# Altium integrated library WE_WR-BHD_Box Header_2.54mm_rev15b.IntLib: 96 symbols (continued)
## WE-2,54mm_Box Header 612050235221 (continued)
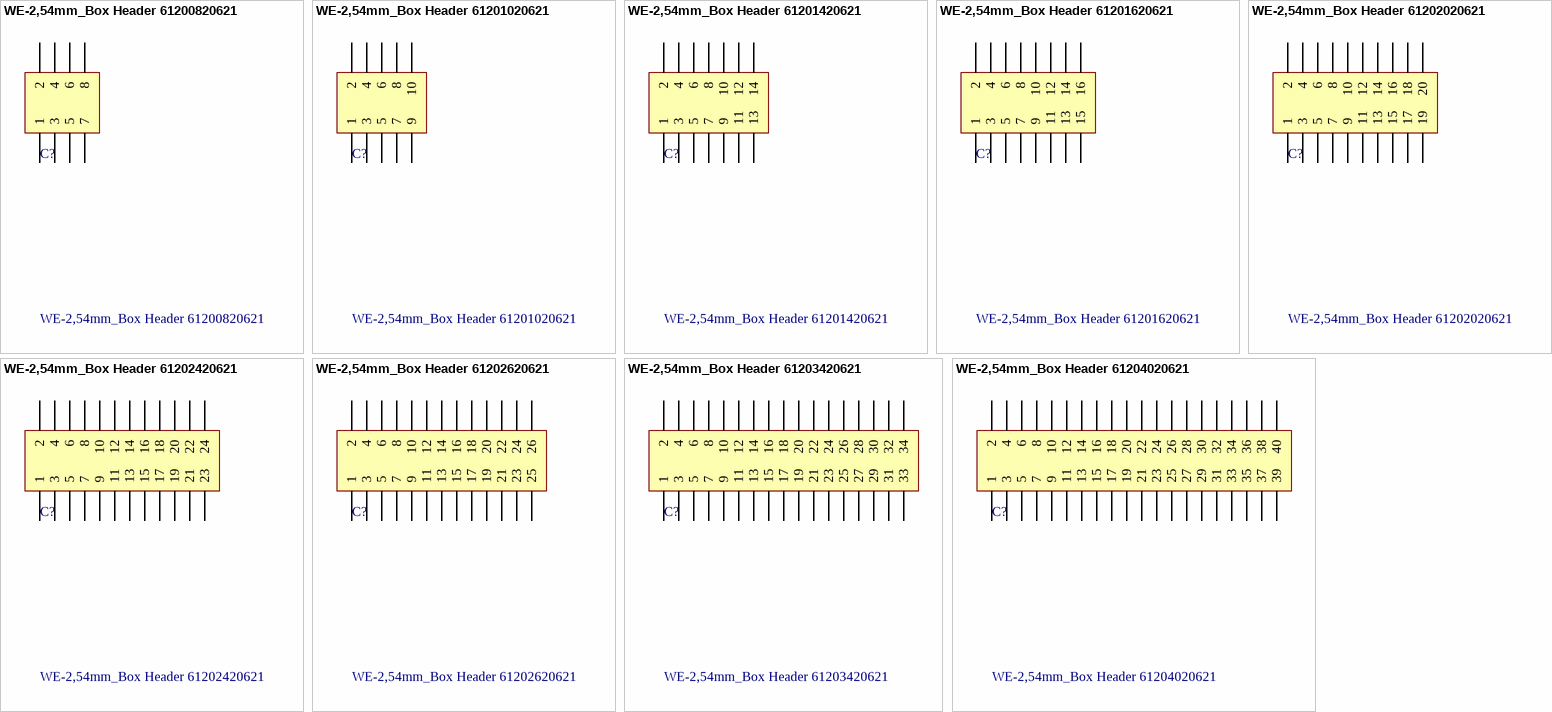
[diagram p4: symbols WE-2,54mm_Box Header 61200820621 to WE-2,54mm_Box Header 61204020621]

## WE-2,54mm_Box Header 61200820621
designator C?
WR-BHD 2.54mm Male SMT Box Header; Manufacturer: Würth Elektronik eiSos GmbH; ComponentLink1 Description: Manufacturer; ComponentLink2 Description: Datasheet; NoPins: 8; Created Date: 8 May 2013; partNo: 61200820621; ComponentLink1URL: http://www.we-online.com; ComponentLink2URL: http://katalog.we-online.de/em/datasheet/6120xx20621.pdf; Created by: Karrer Zheng
footprint 61200820621 (8 pins, SMT, straight, gold plating)
pins: 1, 2, 3, 4, 5, 6, 7, 8

## WE-2,54mm_Box Header 61201020621
designator C?
WR-BHD 2.54mm Male SMT Box Header; Manufacturer: Würth Elektronik eiSos GmbH; ComponentLink1 Description: Manufacturer; ComponentLink2 Description: Datasheet; NoPins: 10; Created Date: 8 May 2013; partNo: 61201020621; ComponentLink1URL: http://www.we-online.com; ComponentLink2URL: http://katalog.we-online.de/em/datasheet/6120xx20621.pdf; Created by: Karrer Zheng
footprint 61201020621 (10 pins, SMT, straight, gold plating)
pins: 1, 2, 3, 4, 5, 6, 7, 8, 9, 10

## WE-2,54mm_Box Header 61201420621
designator C?
WR-BHD 2.54mm Male SMT Box Header; Manufacturer: Würth Elektronik eiSos GmbH; ComponentLink1 Description: Manufacturer; ComponentLink2 Description: Datasheet; NoPins: 14; Created Date: 8 May 2013; partNo: 61201420621; ComponentLink1URL: http://www.we-online.com; ComponentLink2URL: http://katalog.we-online.de/em/datasheet/6120xx20621.pdf; Created by: Karrer Zheng
footprint 61201420621 (14 pins, SMT, straight, gold plating)
pins: 1, 2, 3, 4, 5, 6, 7, 8, 9, 10, 11, 12, 13, 14

## WE-2,54mm_Box Header 61201620621
designator C?
WR-BHD 2.54mm Male SMT Box Header; Manufacturer: Würth Elektronik eiSos GmbH; ComponentLink1 Description: Manufacturer; ComponentLink2 Description: Datasheet; NoPins: 16; Created Date: 8 May 2013; partNo: 61201620621; ComponentLink1URL: http://www.we-online.com; ComponentLink2URL: http://katalog.we-online.de/em/datasheet/6120xx20621.pdf; Created by: Karrer Zheng
footprint 61201620621 (16 pins, SMT, straight, gold plating)
pins: 1, 2, 3, 4, 5, 6, 7, 8, 9, 10, 11, 12, 13, 14, 15, 16

## WE-2,54mm_Box Header 61202020621
designator C?
WR-BHD 2.54mm Male SMT Box Header; Manufacturer: Würth Elektronik eiSos GmbH; ComponentLink1 Description: Manufacturer; ComponentLink2 Description: Datasheet; NoPins: 20; Created Date: 8 May 2013; partNo: 61202020621; ComponentLink1URL: http://www.we-online.com; ComponentLink2URL: http://katalog.we-online.de/em/datasheet/6120xx20621.pdf; Created by: Karrer Zheng
footprint 61202020621 (20 pins, SMT, straight, gold plating)
pins: 1, 2, 3, 4, 5, 6, 7, 8, 9, 10, 11, 12, 13, 14, 15, 16, 17, 18, 19, 20

## WE-2,54mm_Box Header 61202420621
designator C?
WR-BHD 2.54mm Male SMT Box Header; Manufacturer: Würth Elektronik eiSos GmbH; ComponentLink1 Description: Manufacturer; ComponentLink2 Description: Datasheet; NoPins: 24; Created Date: 8 May 2013; partNo: 61202420621; ComponentLink1URL: http://www.we-online.com; ComponentLink2URL: http://katalog.we-online.de/em/datasheet/6120xx20621.pdf; Created by: Karrer Zheng
footprint 61202420621 (24 pins, SMT, straight, gold plating)
pins: 1, 2, 3, 4, 5, 6, 7, 8, 9, 10, 11, 12, 13, 14, 15, 16, 17, 18, 19, 20, 21, 22, 23, 24

## WE-2,54mm_Box Header 61202620621
designator C?
WR-BHD 2.54mm Male SMT Box Header; Manufacturer: Würth Elektronik eiSos GmbH; ComponentLink1 Description: Manufacturer; ComponentLink2 Description: Datasheet; NoPins: 26; Created Date: 8 May 2013; partNo: 61202620621; ComponentLink1URL: http://www.we-online.com; ComponentLink2URL: http://katalog.we-online.de/em/datasheet/6120xx20621.pdf; Created by: Karrer Zheng
footprint 61202620621 (26 pins, SMT, straight, gold plating)
pins: 1, 2, 3, 4, 5, 6, 7, 8, 9, 10, 11, 12, 13, 14, 15, 16, 17, 18, 19, 20, 21, 22, 23, 24, 25, 26

## WE-2,54mm_Box Header 61203420621
designator C?
WR-BHD 2.54mm Male SMT Box Header; Manufacturer: Würth Elektronik eiSos GmbH; ComponentLink1 Description: Manufacturer; ComponentLink2 Description: Datasheet; NoPins: 34; Created Date: 8 May 2013; partNo: 61203420621; ComponentLink1URL: http://www.we-online.com; ComponentLink2URL: http://katalog.we-online.de/em/datasheet/6120xx20621.pdf; Created by: Karrer Zheng
footprint 61203420621 (34 pins, SMT, straight, gold plating)
pins: 1, 2, 3, 4, 5, 6, 7, 8, 9, 10, 11, 12, 13, 14, 15, 16, 17, 18, 19, 20, 21, 22, 23, 24, 25, 26, 27, 28, 29, 30, 31, 32, 33, 34

## WE-2,54mm_Box Header 61204020621
designator C?
WR-BHD 2.54mm Male SMT Box Header; Manufacturer: Würth Elektronik eiSos GmbH; ComponentLink1 Description: Manufacturer; ComponentLink2 Description: Datasheet; NoPins: 40; Created Date: 8 May 2013; partNo: 61204020621; ComponentLink1URL: http://www.we-online.com; ComponentLink2URL: http://katalog.we-online.de/em/datasheet/6120xx20621.pdf; Created by: Karrer Zheng
footprint 61204020621 (40 pins, SMT, straight, gold plating)
pins: 1, 2, 3, 4, 5, 6, 7, 8, 9, 10, 11, 12, 13, 14, 15, 16, 17, 18, 19, 20, 21, 22, 23, 24, 25, 26, 27, 28, 29, 30, 31, 32, 33, 34, 35, 36, 37, 38, 39, 40


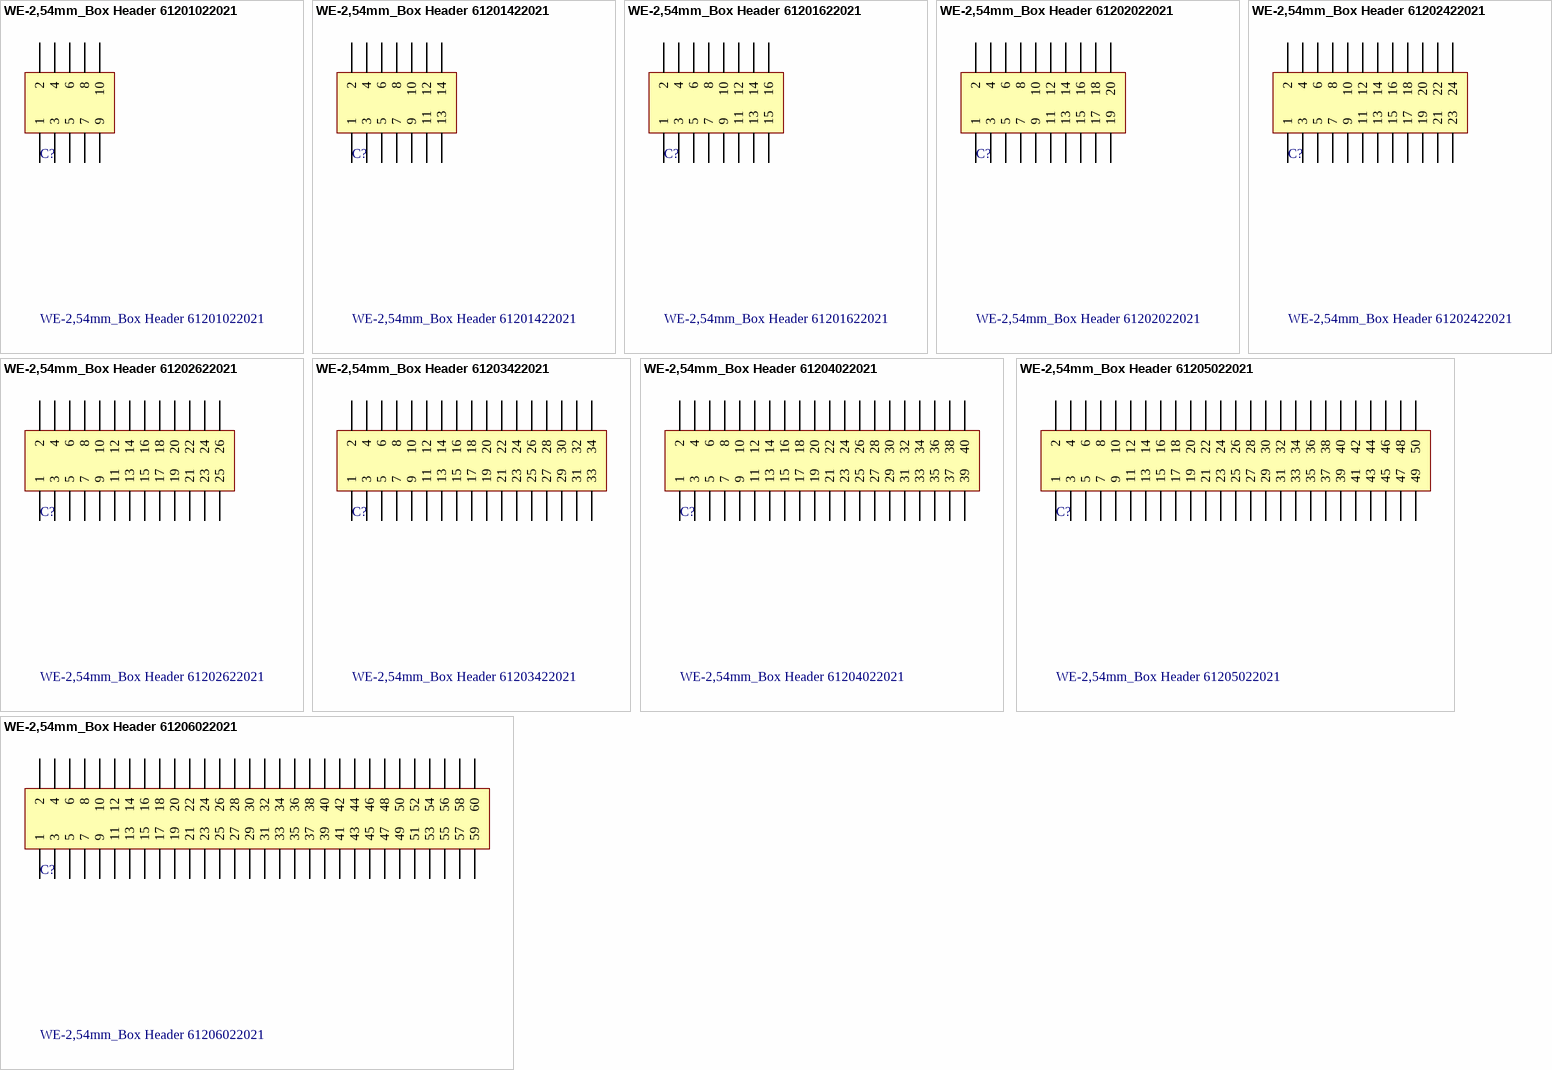
[diagram p5: symbols WE-2,54mm_Box Header 61201022021 to WE-2,54mm_Box Header 61206022021]

## WE-2,54mm_Box Header 61201022021
designator C?
WR-BHD 2.54mm Male Box Header With Lever; Manufacturer: Würth Elektronik eiSos GmbH; ComponentLink1 Description: Manufacturer; ComponentLink2 Description: Datasheet; NoPins: 10; Created Date: 9 May 2013; partNo: 61201022021; ComponentLink1URL: http://www.we-online.com; ComponentLink2URL: http://katalog.we-online.de/em/datasheet/6120xx22021.pdf; Created by: Karrer Zheng
footprint 61201022021 (10 pins, straight, short lever, gold plating)
pins: 1, 2, 3, 4, 5, 6, 7, 8, 9, 10

## WE-2,54mm_Box Header 61201422021
designator C?
WR-BHD 2.54mm Male Box Header With Lever; Manufacturer: Würth Elektronik eiSos GmbH; ComponentLink1 Description: Manufacturer; ComponentLink2 Description: Datasheet; NoPins: 14; Created Date: 9 May 2013; partNo: 61201422021; ComponentLink1URL: http://www.we-online.com; ComponentLink2URL: http://katalog.we-online.de/em/datasheet/6120xx22021.pdf; Created by: Karrer Zheng
footprint 61201422021 (14 pins, straight, short lever, gold plating)
pins: 1, 2, 3, 4, 5, 6, 7, 8, 9, 10, 11, 12, 13, 14

## WE-2,54mm_Box Header 61201622021
designator C?
WR-BHD 2.54mm Male Box Header With Lever; Manufacturer: Würth Elektronik eiSos GmbH; ComponentLink1 Description: Manufacturer; ComponentLink2 Description: Datasheet; NoPins: 16; Created Date: 9 May 2013; partNo: 61201622021; ComponentLink1URL: http://www.we-online.com; ComponentLink2URL: http://katalog.we-online.de/em/datasheet/6120xx22021.pdf; Created by: Karrer Zheng
footprint 61201622021 (16 pins, straight, short lever, gold plating)
pins: 1, 2, 3, 4, 5, 6, 7, 8, 9, 10, 11, 12, 13, 14, 15, 16

## WE-2,54mm_Box Header 61202022021
designator C?
WR-BHD 2.54mm Male Box Header With Lever; Manufacturer: Würth Elektronik eiSos GmbH; ComponentLink1 Description: Manufacturer; ComponentLink2 Description: Datasheet; NoPins: 20; Created Date: 9 May 2013; partNo: 61202022021; ComponentLink1URL: http://www.we-online.com; ComponentLink2URL: http://katalog.we-online.de/em/datasheet/6120xx22021.pdf; Created by: Karrer Zheng
footprint 61202022021 (20 pins, straight, short lever, gold plating)
pins: 1, 2, 3, 4, 5, 6, 7, 8, 9, 10, 11, 12, 13, 14, 15, 16, 17, 18, 19, 20

## WE-2,54mm_Box Header 61202422021
designator C?
WR-BHD 2.54mm Male Box Header With Lever; Manufacturer: Würth Elektronik eiSos GmbH; ComponentLink1 Description: Manufacturer; ComponentLink2 Description: Datasheet; NoPins: 24; Created Date: 9 May 2013; partNo: 61202422021; ComponentLink1URL: http://www.we-online.com; ComponentLink2URL: http://katalog.we-online.de/em/datasheet/6120xx22021.pdf; Created by: Karrer Zheng
footprint 61202422021 (24 pins, straight, short lever, gold plating)
pins: 1, 2, 3, 4, 5, 6, 7, 8, 9, 10, 11, 12, 13, 14, 15, 16, 17, 18, 19, 20, 21, 22, 23, 24

## WE-2,54mm_Box Header 61202622021
designator C?
WR-BHD 2.54mm Male Box Header With Lever; Manufacturer: Würth Elektronik eiSos GmbH; ComponentLink1 Description: Manufacturer; ComponentLink2 Description: Datasheet; NoPins: 26; Created Date: 9 May 2013; partNo: 61202622021; ComponentLink1URL: http://www.we-online.com; ComponentLink2URL: http://katalog.we-online.de/em/datasheet/6120xx22021.pdf; Created by: Karrer Zheng
footprint 61202622021 (26 pins, straight, short lever, gold plating)
pins: 1, 2, 3, 4, 5, 6, 7, 8, 9, 10, 11, 12, 13, 14, 15, 16, 17, 18, 19, 20, 21, 22, 23, 24, 25, 26

## WE-2,54mm_Box Header 61203422021
designator C?
WR-BHD 2.54mm Male Box Header With Lever; Manufacturer: Würth Elektronik eiSos GmbH; ComponentLink1 Description: Manufacturer; ComponentLink2 Description: Datasheet; NoPins: 34; Created Date: 9 May 2013; partNo: 61203422021; ComponentLink1URL: http://www.we-online.com; ComponentLink2URL: http://katalog.we-online.de/em/datasheet/6120xx22021.pdf; Created by: Karrer Zheng
footprint 61203422021 (34 pins, straight, short lever, gold plating)
pins: 1, 2, 3, 4, 5, 6, 7, 8, 9, 10, 11, 12, 13, 14, 15, 16, 17, 18, 19, 20, 21, 22, 23, 24, 25, 26, 27, 28, 29, 30, 31, 32, 33, 34

## WE-2,54mm_Box Header 61204022021
designator C?
WR-BHD 2.54mm Male Box Header With Lever; Manufacturer: Würth Elektronik eiSos GmbH; ComponentLink1 Description: Manufacturer; ComponentLink2 Description: Datasheet; NoPins: 40; Created Date: 9 May 2013; partNo: 61204022021; ComponentLink1URL: http://www.we-online.com; ComponentLink2URL: http://katalog.we-online.de/em/datasheet/6120xx22021.pdf; Created by: Karrer Zheng
footprint 61204022021 (40 pins, straight, short lever, gold plating)
pins: 1, 2, 3, 4, 5, 6, 7, 8, 9, 10, 11, 12, 13, 14, 15, 16, 17, 18, 19, 20, 21, 22, 23, 24, 25, 26, 27, 28, 29, 30, 31, 32, 33, 34, 35, 36, 37, 38, 39, 40

## WE-2,54mm_Box Header 61205022021
designator C?
WR-BHD 2.54mm Male Box Header With Lever; Manufacturer: Würth Elektronik eiSos GmbH; ComponentLink1 Description: Manufacturer; ComponentLink2 Description: Datasheet; NoPins: 50; Created Date: 9 May 2013; partNo: 61205022021; ComponentLink1URL: http://www.we-online.com; ComponentLink2URL: http://katalog.we-online.de/em/datasheet/6120xx22021.pdf; Created by: Karrer Zheng
footprint 61205022021 (50 pins, straight, short lever, gold plating)
pins: 1, 2, 3, 4, 5, 6, 7, 8, 9, 10, 11, 12, 13, 14, 15, 16, 17, 18, 19, 20, 21, 22, 23, 24, 25, 26, 27, 28, 29, 30, 31, 32, 33, 34, 35, 36, 37, 38, 39, 40, 41, 42, 43, 44, 45, 46, 47, 48, 49, 50

## WE-2,54mm_Box Header 61206022021
designator C?
WR-BHD 2.54mm Male Box Header With Lever; Manufacturer: Würth Elektronik eiSos GmbH; ComponentLink1 Description: Manufacturer; ComponentLink2 Description: Datasheet; NoPins: 60; Created Date: 9 May 2013; partNo: 61206022021; ComponentLink1URL: http://www.we-online.com; ComponentLink2URL: http://katalog.we-online.de/em/datasheet/6120xx22021.pdf; Created by: Karrer Zheng
footprint 61206022021 (60 pins, straight, short lever, gold plating)
pins: 1, 2, 3, 4, 5, 6, 7, 8, 9, 10, 11, 12, 13, 14, 15, 16, 17, 18, 19, 20, 21, 22, 23, 24, 25, 26, 27, 28, 29, 30, 31, 32, 33, 34, 35, 36, 37, 38, 39, 40, 41, 42, 43, 44, 45, 46, 47, 48, 49, 50, 51, 52, 53, 54, 55, 56, 57, 58, 59, 60


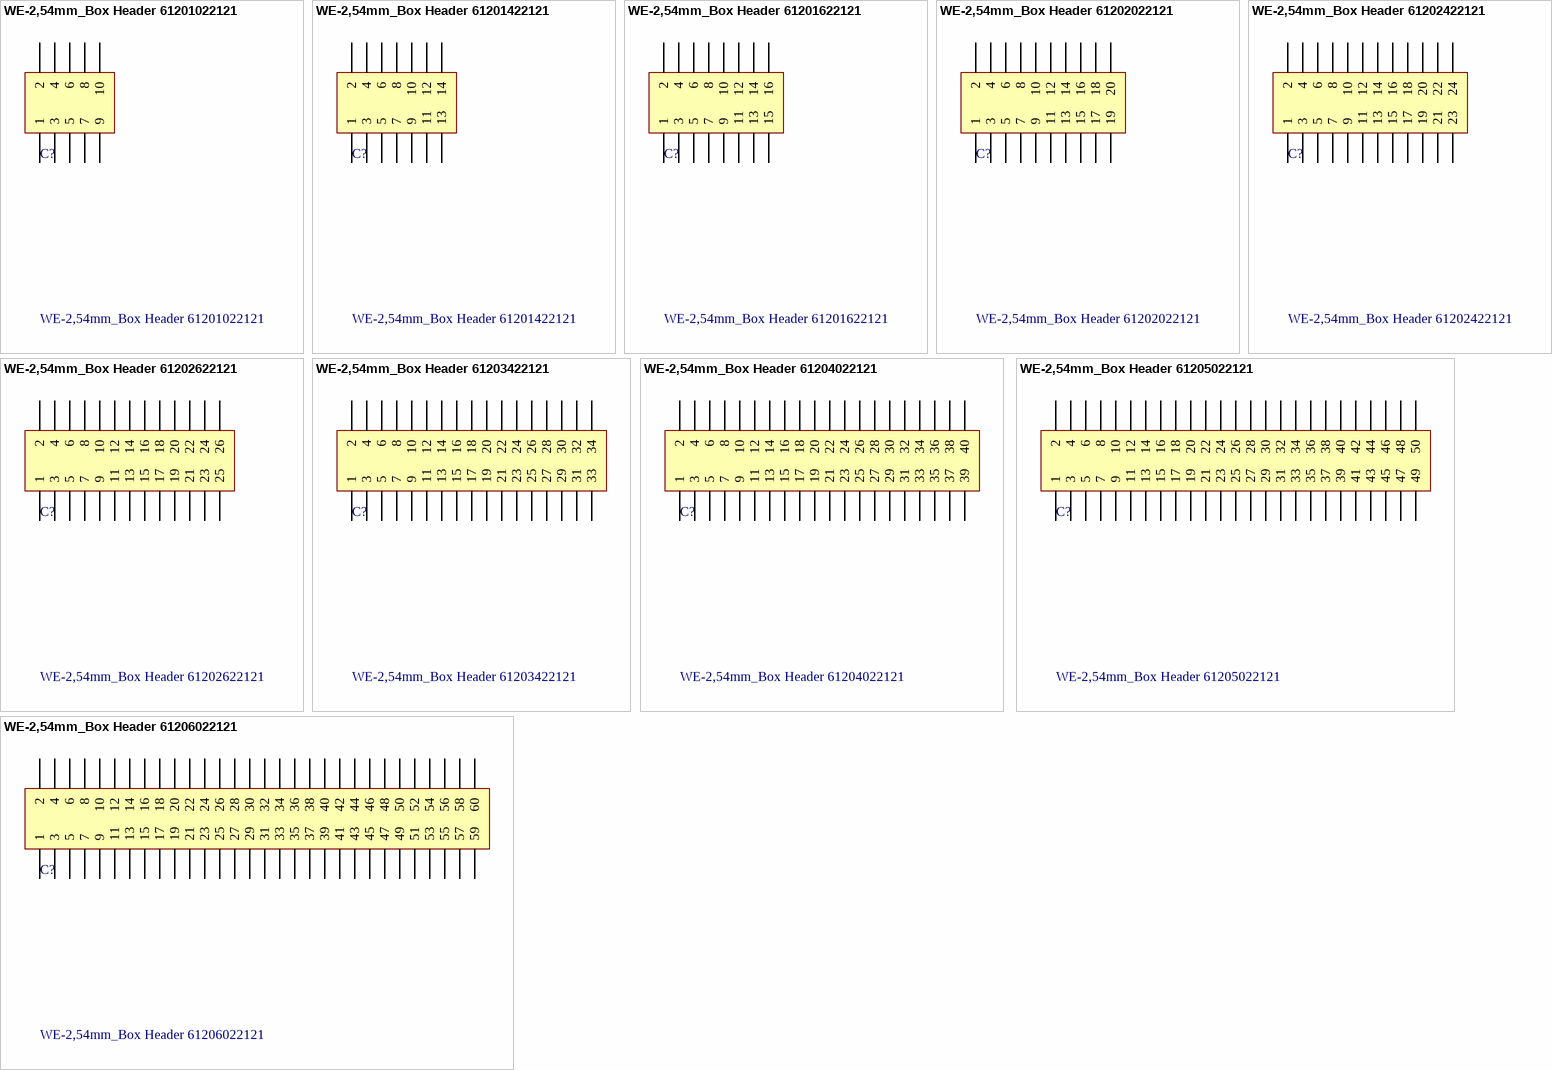
[diagram p6: symbols WE-2,54mm_Box Header 61201022121 to WE-2,54mm_Box Header 61206022121]

## WE-2,54mm_Box Header 61201022121
designator C?
WR-BHD 2.54mm Male Angled Box Header With Lever; Manufacturer: Würth Elektronik eiSos GmbH; ComponentLink1 Description: Manufacturer; ComponentLink2 Description: Datasheet; NoPins: 10; Created Date: 9 May 2013; partNo: 61201022121; ComponentLink1URL: http://www.we-online.com; ComponentLink2URL: http://katalog.we-online.de/em/datasheet/6120xx22121.pdf; Created by: Karrer Zheng
footprint 61201022121 (10 pins, right angeled, short lever, gold plating)
pins: 1, 2, 3, 4, 5, 6, 7, 8, 9, 10

## WE-2,54mm_Box Header 61201422121
designator C?
WR-BHD 2.54mm Male Angled Box Header With Lever; Manufacturer: Würth Elektronik eiSos GmbH; ComponentLink1 Description: Manufacturer; ComponentLink2 Description: Datasheet; NoPins: 14; Created Date: 9 May 2013; partNo: 61201422121; ComponentLink1URL: http://www.we-online.com; ComponentLink2URL: http://katalog.we-online.de/em/datasheet/6120xx22121.pdf; Created by: Karrer Zheng
footprint 61201422121 (14 pins, right angeled, short lever, gold plating)
pins: 1, 2, 3, 4, 5, 6, 7, 8, 9, 10, 11, 12, 13, 14

## WE-2,54mm_Box Header 61201622121
designator C?
WR-BHD 2.54mm Male Angled Box Header With Lever; Manufacturer: Würth Elektronik eiSos GmbH; ComponentLink1 Description: Manufacturer; ComponentLink2 Description: Datasheet; NoPins: 16; Created Date: 9 May 2013; partNo: 61201622121; ComponentLink1URL: http://www.we-online.com; ComponentLink2URL: http://katalog.we-online.de/em/datasheet/6120xx22121.pdf; Created by: Karrer Zheng
footprint 61201622121 (16 pins, right angeled, short lever, gold plating)
pins: 1, 2, 3, 4, 5, 6, 7, 8, 9, 10, 11, 12, 13, 14, 15, 16

## WE-2,54mm_Box Header 61202022121
designator C?
WR-BHD 2.54mm Male Angled Box Header With Lever; Manufacturer: Würth Elektronik eiSos GmbH; ComponentLink1 Description: Manufacturer; ComponentLink2 Description: Datasheet; NoPins: 20; Created Date: 9 May 2013; partNo: 61202022121; ComponentLink1URL: http://www.we-online.com; ComponentLink2URL: http://katalog.we-online.de/em/datasheet/6120xx22121.pdf; Created by: Karrer Zheng
footprint 61202022121 (20 pins, right angeled, short lever, gold plating)
pins: 1, 2, 3, 4, 5, 6, 7, 8, 9, 10, 11, 12, 13, 14, 15, 16, 17, 18, 19, 20

## WE-2,54mm_Box Header 61202422121
designator C?
WR-BHD 2.54mm Male Angled Box Header With Lever; Manufacturer: Würth Elektronik eiSos GmbH; ComponentLink1 Description: Manufacturer; ComponentLink2 Description: Datasheet; NoPins: 24; Created Date: 9 May 2013; partNo: 61202422121; ComponentLink1URL: http://www.we-online.com; ComponentLink2URL: http://katalog.we-online.de/em/datasheet/6120xx22121.pdf; Created by: Karrer Zheng
footprint 61202422121 (24 pins, right angeled, short lever, gold plating)
pins: 1, 2, 3, 4, 5, 6, 7, 8, 9, 10, 11, 12, 13, 14, 15, 16, 17, 18, 19, 20, 21, 22, 23, 24

## WE-2,54mm_Box Header 61202622121
designator C?
WR-BHD 2.54mm Male Angled Box Header With Lever; Manufacturer: Würth Elektronik eiSos GmbH; ComponentLink1 Description: Manufacturer; ComponentLink2 Description: Datasheet; NoPins: 26; Created Date: 9 May 2013; partNo: 61202622121; ComponentLink1URL: http://www.we-online.com; ComponentLink2URL: http://katalog.we-online.de/em/datasheet/6120xx22121.pdf; Created by: Karrer Zheng
footprint 61202622121 (26 pins, right angeled, short lever, gold plating)
pins: 1, 2, 3, 4, 5, 6, 7, 8, 9, 10, 11, 12, 13, 14, 15, 16, 17, 18, 19, 20, 21, 22, 23, 24, 25, 26

## WE-2,54mm_Box Header 61203422121
designator C?
WR-BHD 2.54mm Male Angled Box Header With Lever; Manufacturer: Würth Elektronik eiSos GmbH; ComponentLink1 Description: Manufacturer; ComponentLink2 Description: Datasheet; NoPins: 34; Created Date: 9 May 2013; partNo: 61203422121; ComponentLink1URL: http://www.we-online.com; ComponentLink2URL: http://katalog.we-online.de/em/datasheet/6120xx22121.pdf; Created by: Karrer Zheng
footprint 61203422121 (34 pins, right angeled, short lever, gold plating)
pins: 1, 2, 3, 4, 5, 6, 7, 8, 9, 10, 11, 12, 13, 14, 15, 16, 17, 18, 19, 20, 21, 22, 23, 24, 25, 26, 27, 28, 29, 30, 31, 32, 33, 34

## WE-2,54mm_Box Header 61204022121
designator C?
WR-BHD 2.54mm Male Angled Box Header With Lever; Manufacturer: Würth Elektronik eiSos GmbH; ComponentLink1 Description: Manufacturer; ComponentLink2 Description: Datasheet; NoPins: 40; Created Date: 9 May 2013; partNo: 61204022121; ComponentLink1URL: http://www.we-online.com; ComponentLink2URL: http://katalog.we-online.de/em/datasheet/6120xx22121.pdf; Created by: Karrer Zheng
footprint 61204022121 (40 pins, right angeled, short lever, gold plating)
pins: 1, 2, 3, 4, 5, 6, 7, 8, 9, 10, 11, 12, 13, 14, 15, 16, 17, 18, 19, 20, 21, 22, 23, 24, 25, 26, 27, 28, 29, 30, 31, 32, 33, 34, 35, 36, 37, 38, 39, 40

## WE-2,54mm_Box Header 61205022121
designator C?
WR-BHD 2.54mm Male Angled Box Header With Lever; Manufacturer: Würth Elektronik eiSos GmbH; ComponentLink1 Description: Manufacturer; ComponentLink2 Description: Datasheet; NoPins: 50; Created Date: 9 May 2013; partNo: 61205022121; ComponentLink1URL: http://www.we-online.com; ComponentLink2URL: http://katalog.we-online.de/em/datasheet/6120xx22121.pdf; Created by: Karrer Zheng
footprint 61205022121 (50 pins, right angeled, short lever, gold plating)
pins: 1, 2, 3, 4, 5, 6, 7, 8, 9, 10, 11, 12, 13, 14, 15, 16, 17, 18, 19, 20, 21, 22, 23, 24, 25, 26, 27, 28, 29, 30, 31, 32, 33, 34, 35, 36, 37, 38, 39, 40, 41, 42, 43, 44, 45, 46, 47, 48, 49, 50

## WE-2,54mm_Box Header 61206022121
designator C?
WR-BHD 2.54mm Male Angled Box Header With Lever; Manufacturer: Würth Elektronik eiSos GmbH; ComponentLink1 Description: Manufacturer; ComponentLink2 Description: Datasheet; NoPins: 60; Created Date: 9 May 2013; partNo: 61206022121; ComponentLink1URL: http://www.we-online.com; ComponentLink2URL: http://katalog.we-online.de/em/datasheet/6120xx22121.pdf; Created by: Karrer Zheng
footprint 61206022121 (60 pins, right angeled, short lever, gold plating)
pins: 1, 2, 3, 4, 5, 6, 7, 8, 9, 10, 11, 12, 13, 14, 15, 16, 17, 18, 19, 20, 21, 22, 23, 24, 25, 26, 27, 28, 29, 30, 31, 32, 33, 34, 35, 36, 37, 38, 39, 40, 41, 42, 43, 44, 45, 46, 47, 48, 49, 50, 51, 52, 53, 54, 55, 56, 57, 58, 59, 60


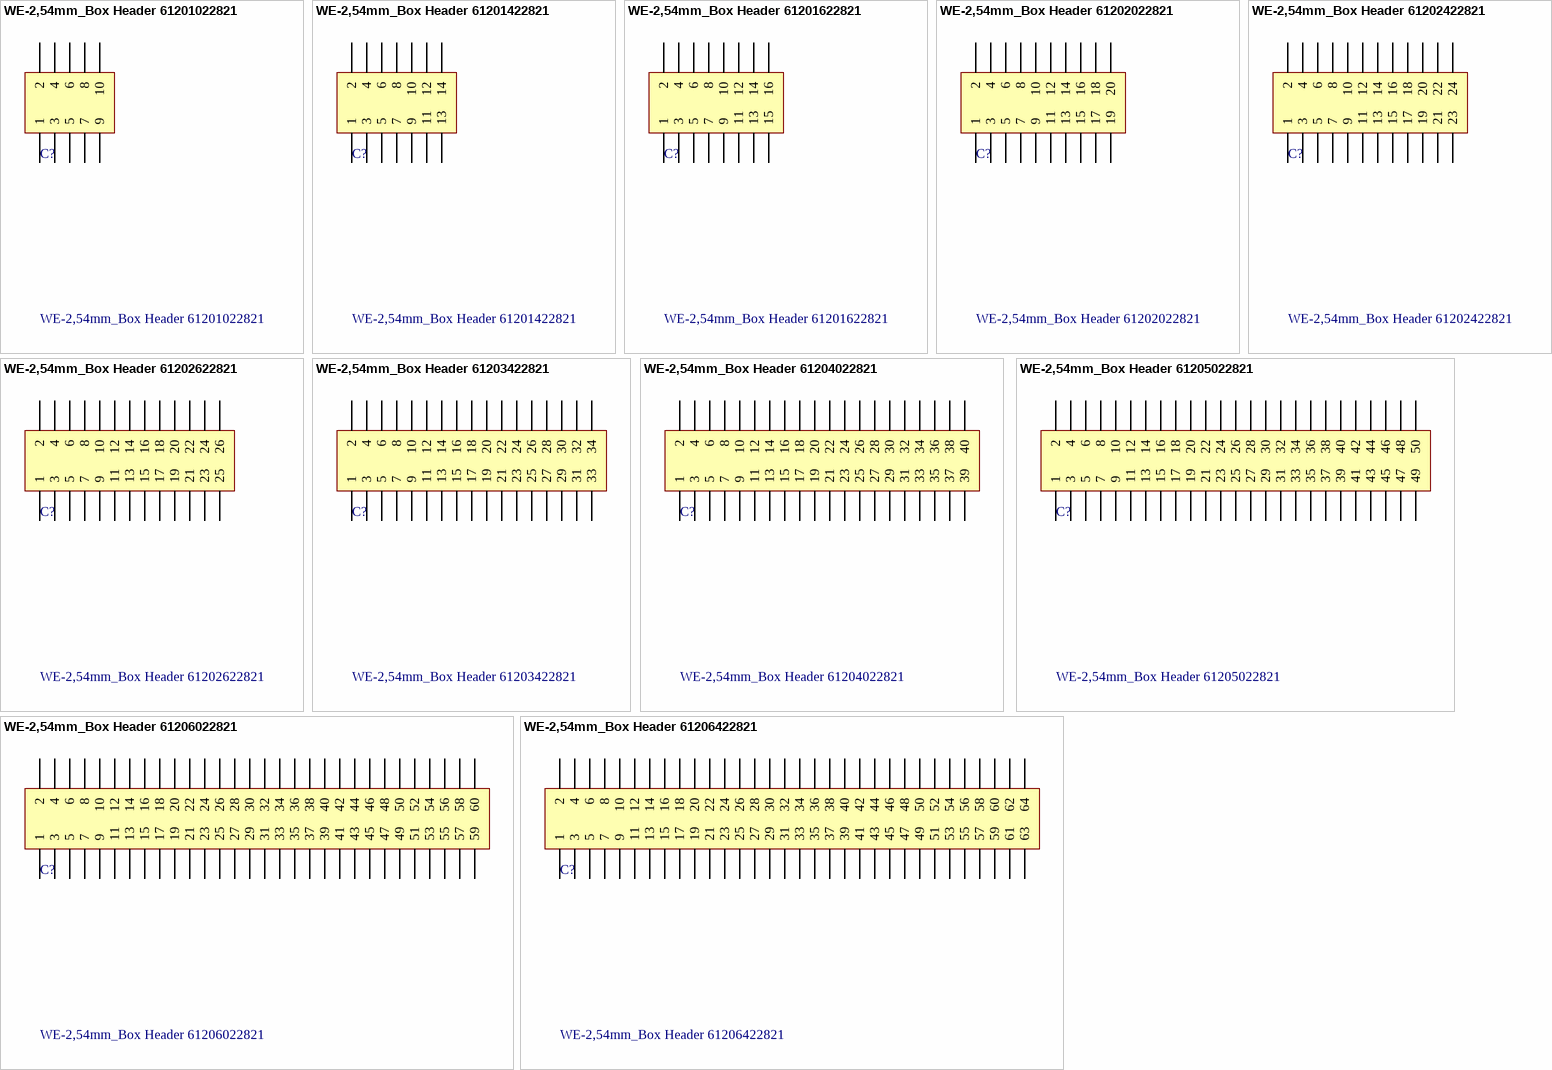
[diagram p7: symbols WE-2,54mm_Box Header 61201022821 to WE-2,54mm_Box Header 61206422821]

## WE-2,54mm_Box Header 61201022821
designator C?
WR-BHD 2.54mm Male Box Header With Lever; Manufacturer: Würth Elektronik eiSos GmbH; ComponentLink1 Description: Manufacturer; ComponentLink2 Description: Datasheet; NoPins: 10; Created Date: 10 May 2013; partNo: 61201022821; ComponentLink1URL: http://www.we-online.com; ComponentLink2URL: http://katalog.we-online.de/em/datasheet/6120xx22821.pdf; Created by: Karrer Zheng
footprint 61201022821 (10 pins, straight, long lever, gold plating)
pins: 1, 2, 3, 4, 5, 6, 7, 8, 9, 10

## WE-2,54mm_Box Header 61201422821
designator C?
WR-BHD 2.54mm Male Box Header With Lever; Manufacturer: Würth Elektronik eiSos GmbH; ComponentLink1 Description: Manufacturer; ComponentLink2 Description: Datasheet; NoPins: 14; Created Date: 10 May 2013; partNo: 61201422821; ComponentLink1URL: http://www.we-online.com; ComponentLink2URL: http://katalog.we-online.de/em/datasheet/6120xx22821.pdf; Created by: Karrer Zheng
footprint 61201422821 (14 pins, straight, long lever, gold plating)
pins: 1, 2, 3, 4, 5, 6, 7, 8, 9, 10, 11, 12, 13, 14

## WE-2,54mm_Box Header 61201622821
designator C?
WR-BHD 2.54mm Male Box Header With Lever; Manufacturer: Würth Elektronik eiSos GmbH; ComponentLink1 Description: Manufacturer; ComponentLink2 Description: Datasheet; NoPins: 16; Created Date: 10 May 2013; partNo: 61201622821; ComponentLink1URL: http://www.we-online.com; ComponentLink2URL: http://katalog.we-online.de/em/datasheet/6120xx22821.pdf; Created by: Karrer Zheng
footprint 61201622821 (16 pins, straight, long lever, gold plating)
pins: 1, 2, 3, 4, 5, 6, 7, 8, 9, 10, 11, 12, 13, 14, 15, 16

## WE-2,54mm_Box Header 61202022821
designator C?
WR-BHD 2.54mm Male Box Header With Lever; Manufacturer: Würth Elektronik eiSos GmbH; ComponentLink1 Description: Manufacturer; ComponentLink2 Description: Datasheet; NoPins: 20; Created Date: 10 May 2013; partNo: 61202022821; ComponentLink1URL: http://www.we-online.com; ComponentLink2URL: http://katalog.we-online.de/em/datasheet/6120xx22821.pdf; Created by: Karrer Zheng
footprint 61202022821 (20 pins, straight, long lever, gold plating)
pins: 1, 2, 3, 4, 5, 6, 7, 8, 9, 10, 11, 12, 13, 14, 15, 16, 17, 18, 19, 20

## WE-2,54mm_Box Header 61202422821
designator C?
WR-BHD 2.54mm Male Box Header With Lever; Manufacturer: Würth Elektronik eiSos GmbH; ComponentLink1 Description: Manufacturer; ComponentLink2 Description: Datasheet; NoPins: 24; Created Date: 10 May 2013; partNo: 61202422821; ComponentLink1URL: http://www.we-online.com; ComponentLink2URL: http://katalog.we-online.de/em/datasheet/6120xx22821.pdf; Created by: Karrer Zheng
footprint 61202422821 (24 pins, straight, long lever, gold plating)
pins: 1, 2, 3, 4, 5, 6, 7, 8, 9, 10, 11, 12, 13, 14, 15, 16, 17, 18, 19, 20, 21, 22, 23, 24

## WE-2,54mm_Box Header 61202622821
designator C?
WR-BHD 2.54mm Male Box Header With Lever; Manufacturer: Würth Elektronik eiSos GmbH; ComponentLink1 Description: Manufacturer; ComponentLink2 Description: Datasheet; NoPins: 26; Created Date: 10 May 2013; partNo: 61202622821; ComponentLink1URL: http://www.we-online.com; ComponentLink2URL: http://katalog.we-online.de/em/datasheet/6120xx22821.pdf; Created by: Karrer Zheng
footprint 61202622821 (26 pins, straight, long lever, gold plating)
pins: 1, 2, 3, 4, 5, 6, 7, 8, 9, 10, 11, 12, 13, 14, 15, 16, 17, 18, 19, 20, 21, 22, 23, 24, 25, 26

## WE-2,54mm_Box Header 61203422821
designator C?
WR-BHD 2.54mm Male Box Header With Lever; Manufacturer: Würth Elektronik eiSos GmbH; ComponentLink1 Description: Manufacturer; ComponentLink2 Description: Datasheet; NoPins: 34; Created Date: 10 May 2013; partNo: 61203422821; ComponentLink1URL: http://www.we-online.com; ComponentLink2URL: http://katalog.we-online.de/em/datasheet/6120xx22821.pdf; Created by: Karrer Zheng
footprint 61203422821 (34 pins, straight, long lever, gold plating)
pins: 1, 2, 3, 4, 5, 6, 7, 8, 9, 10, 11, 12, 13, 14, 15, 16, 17, 18, 19, 20, 21, 22, 23, 24, 25, 26, 27, 28, 29, 30, 31, 32, 33, 34

## WE-2,54mm_Box Header 61204022821
designator C?
WR-BHD 2.54mm Male Box Header With Lever; Manufacturer: Würth Elektronik eiSos GmbH; ComponentLink1 Description: Manufacturer; ComponentLink2 Description: Datasheet; NoPins: 40; Created Date: 10 May 2013; partNo: 61204022821; ComponentLink1URL: http://www.we-online.com; ComponentLink2URL: http://katalog.we-online.de/em/datasheet/6120xx22821.pdf; Created by: Karrer Zheng
footprint 61204022821 (40 pins, straight, long lever, gold plating)
pins: 1, 2, 3, 4, 5, 6, 7, 8, 9, 10, 11, 12, 13, 14, 15, 16, 17, 18, 19, 20, 21, 22, 23, 24, 25, 26, 27, 28, 29, 30, 31, 32, 33, 34, 35, 36, 37, 38, 39, 40

## WE-2,54mm_Box Header 61205022821
designator C?
WR-BHD 2.54mm Male Box Header With Lever; Manufacturer: Würth Elektronik eiSos GmbH; ComponentLink1 Description: Manufacturer; ComponentLink2 Description: Datasheet; NoPins: 50; Created Date: 10 May 2013; partNo: 61205022821; ComponentLink1URL: http://www.we-online.com; ComponentLink2URL: http://katalog.we-online.de/em/datasheet/6120xx22821.pdf; Created by: Karrer Zheng
footprint 61205022821 (50 pins, straight, long lever, gold plating)
pins: 1, 2, 3, 4, 5, 6, 7, 8, 9, 10, 11, 12, 13, 14, 15, 16, 17, 18, 19, 20, 21, 22, 23, 24, 25, 26, 27, 28, 29, 30, 31, 32, 33, 34, 35, 36, 37, 38, 39, 40, 41, 42, 43, 44, 45, 46, 47, 48, 49, 50

## WE-2,54mm_Box Header 61206022821
designator C?
WR-BHD 2.54mm Male Box Header With Lever; Manufacturer: Würth Elektronik eiSos GmbH; ComponentLink1 Description: Manufacturer; ComponentLink2 Description: Datasheet; NoPins: 60; Created Date: 10 May 2013; partNo: 61206022821; ComponentLink1URL: http://www.we-online.com; ComponentLink2URL: http://katalog.we-online.de/em/datasheet/6120xx22821.pdf; Created by: Karrer Zheng
footprint 61206022821 (60 pins, straight, long lever, gold plating)
pins: 1, 2, 3, 4, 5, 6, 7, 8, 9, 10, 11, 12, 13, 14, 15, 16, 17, 18, 19, 20, 21, 22, 23, 24, 25, 26, 27, 28, 29, 30, 31, 32, 33, 34, 35, 36, 37, 38, 39, 40, 41, 42, 43, 44, 45, 46, 47, 48, 49, 50, 51, 52, 53, 54, 55, 56, 57, 58, 59, 60

## WE-2,54mm_Box Header 61206422821
designator C?
WR-BHD 2.54mm Male Box Header With Lever; Manufacturer: Würth Elektronik eiSos GmbH; ComponentLink1 Description: Manufacturer; ComponentLink2 Description: Datasheet; NoPins: 64; Created Date: 10 May 2013; partNo: 61206422821; ComponentLink1URL: http://www.we-online.com; ComponentLink2URL: http://katalog.we-online.de/em/datasheet/6120xx22821.pdf; Created by: Karrer Zheng
footprint 61206422821 (64 pins, straight, long lever, gold plating)
pins: 1, 2, 3, 4, 5, 6, 7, 8, 9, 10, 11, 12, 13, 14, 15, 16, 17, 18, 19, 20, 21, 22, 23, 24, 25, 26, 27, 28, 29, 30, 31, 32, 33, 34, 35, 36, 37, 38, 39, 40, 41, 42, 43, 44, 45, 46, 47, 48, 49, 50, 51, 52, 53, 54, 55, 56, 57, 58, 59, 60, 61, 62, 63, 64


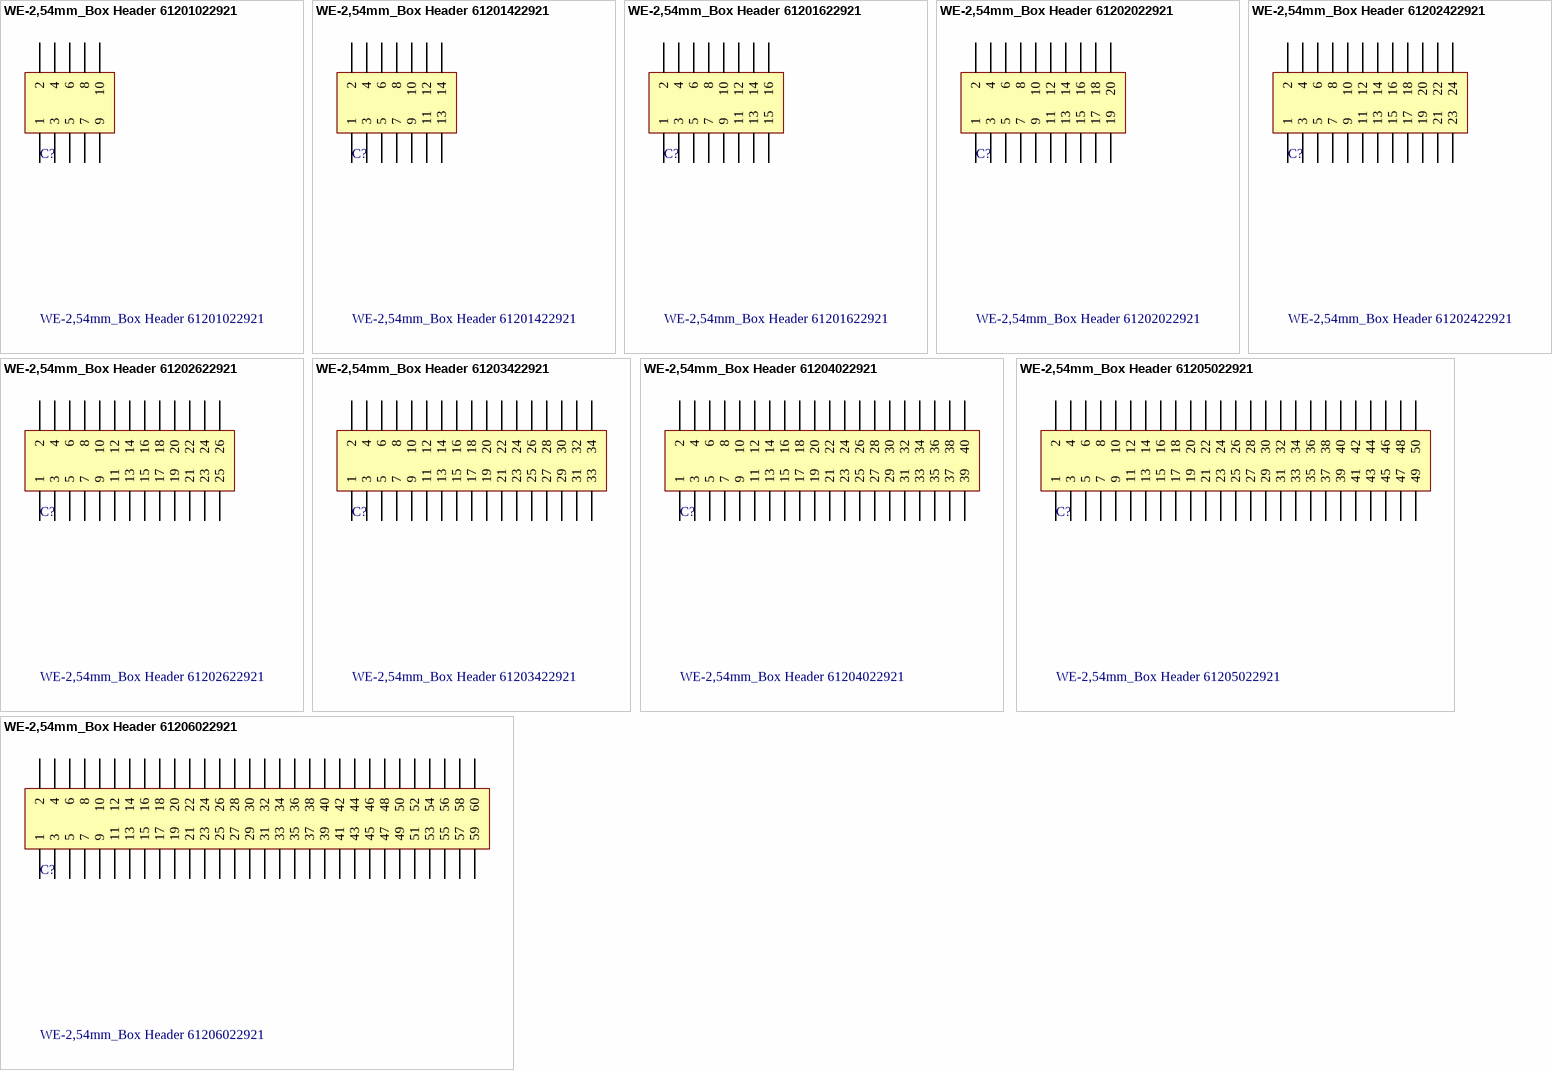
[diagram p8: symbols WE-2,54mm_Box Header 61201022921 to WE-2,54mm_Box Header 61206022921]

## WE-2,54mm_Box Header 61201022921
designator C?
WR-BHD 2.54mm Male Angled Box Header With Lever; Manufacturer: Würth Elektronik eiSos GmbH; ComponentLink1 Description: Manufacturer; ComponentLink2 Description: Datasheet; NoPins: 10; Created Date: 9 May 2013; partNo: 61201022921; ComponentLink1URL: http://www.we-online.com; ComponentLink2URL: http://katalog.we-online.de/em/datasheet/6120xx22921.pdf; Created by: Karrer Zheng
footprint 61201022921 (10 pins, right angeled, long lever, gold plating)
pins: 1, 2, 3, 4, 5, 6, 7, 8, 9, 10

## WE-2,54mm_Box Header 61201422921
designator C?
WR-BHD 2.54mm Male Angled Box Header With Lever; Manufacturer: Würth Elektronik eiSos GmbH; ComponentLink1 Description: Manufacturer; ComponentLink2 Description: Datasheet; NoPins: 14; Created Date: 9 May 2013; partNo: 61201422921; ComponentLink1URL: http://www.we-online.com; ComponentLink2URL: http://katalog.we-online.de/em/datasheet/6120xx22921.pdf; Created by: Karrer Zheng
footprint 61201422921 (14 pins, right angeled, long lever, gold plating)
pins: 1, 2, 3, 4, 5, 6, 7, 8, 9, 10, 11, 12, 13, 14

## WE-2,54mm_Box Header 61201622921
designator C?
WR-BHD 2.54mm Male Angled Box Header With Lever; Manufacturer: Würth Elektronik eiSos GmbH; ComponentLink1 Description: Manufacturer; ComponentLink2 Description: Datasheet; NoPins: 16; Created Date: 9 May 2013; partNo: 61201622921; ComponentLink1URL: http://www.we-online.com; ComponentLink2URL: http://katalog.we-online.de/em/datasheet/6120xx22921.pdf; Created by: Karrer Zheng
footprint 61201622921 (16 pins, right angeled, long lever, gold plating)
pins: 1, 2, 3, 4, 5, 6, 7, 8, 9, 10, 11, 12, 13, 14, 15, 16

## WE-2,54mm_Box Header 61202022921
designator C?
WR-BHD 2.54mm Male Angled Box Header With Lever; Manufacturer: Würth Elektronik eiSos GmbH; ComponentLink1 Description: Manufacturer; ComponentLink2 Description: Datasheet; NoPins: 20; Created Date: 9 May 2013; partNo: 61202022921; ComponentLink1URL: http://www.we-online.com; ComponentLink2URL: http://katalog.we-online.de/em/datasheet/6120xx22921.pdf; Created by: Karrer Zheng
footprint 61202022921 (20 pins, right angeled, long lever, gold plating)
pins: 1, 2, 3, 4, 5, 6, 7, 8, 9, 10, 11, 12, 13, 14, 15, 16, 17, 18, 19, 20

## WE-2,54mm_Box Header 61202422921
designator C?
WR-BHD 2.54mm Male Angled Box Header With Lever; Manufacturer: Würth Elektronik eiSos GmbH; ComponentLink1 Description: Manufacturer; ComponentLink2 Description: Datasheet; NoPins: 24; Created Date: 9 May 2013; partNo: 61202422921; ComponentLink1URL: http://www.we-online.com; ComponentLink2URL: http://katalog.we-online.de/em/datasheet/6120xx22921.pdf; Created by: Karrer Zheng
footprint 61202422921 (24 pins, right angeled, long lever, gold plating)
pins: 1, 2, 3, 4, 5, 6, 7, 8, 9, 10, 11, 12, 13, 14, 15, 16, 17, 18, 19, 20, 21, 22, 23, 24

## WE-2,54mm_Box Header 61202622921
designator C?
WR-BHD 2.54mm Male Angled Box Header With Lever; Manufacturer: Würth Elektronik eiSos GmbH; ComponentLink1 Description: Manufacturer; ComponentLink2 Description: Datasheet; NoPins: 26; Created Date: 9 May 2013; partNo: 61202622921; ComponentLink1URL: http://www.we-online.com; ComponentLink2URL: http://katalog.we-online.de/em/datasheet/6120xx22921.pdf; Created by: Karrer Zheng
footprint 61202622921 (26 pins, right angeled, long lever, gold plating)
pins: 1, 2, 3, 4, 5, 6, 7, 8, 9, 10, 11, 12, 13, 14, 15, 16, 17, 18, 19, 20, 21, 22, 23, 24, 25, 26

## WE-2,54mm_Box Header 61203422921
designator C?
WR-BHD 2.54mm Male Angled Box Header With Lever; Manufacturer: Würth Elektronik eiSos GmbH; ComponentLink1 Description: Manufacturer; ComponentLink2 Description: Datasheet; NoPins: 34; Created Date: 9 May 2013; partNo: 61203422921; ComponentLink1URL: http://www.we-online.com; ComponentLink2URL: http://katalog.we-online.de/em/datasheet/6120xx22921.pdf; Created by: Karrer Zheng
footprint 61203422921 (34 pins, right angeled, long lever, gold plating)
pins: 1, 2, 3, 4, 5, 6, 7, 8, 9, 10, 11, 12, 13, 14, 15, 16, 17, 18, 19, 20, 21, 22, 23, 24, 25, 26, 27, 28, 29, 30, 31, 32, 33, 34

## WE-2,54mm_Box Header 61204022921
designator C?
WR-BHD 2.54mm Male Angled Box Header With Lever; Manufacturer: Würth Elektronik eiSos GmbH; ComponentLink1 Description: Manufacturer; ComponentLink2 Description: Datasheet; NoPins: 40; Created Date: 9 May 2013; partNo: 61204022921; ComponentLink1URL: http://www.we-online.com; ComponentLink2URL: http://katalog.we-online.de/em/datasheet/6120xx22921.pdf; Created by: Karrer Zheng
footprint 61204022921 (40 pins, right angeled, long lever, gold plating)
pins: 1, 2, 3, 4, 5, 6, 7, 8, 9, 10, 11, 12, 13, 14, 15, 16, 17, 18, 19, 20, 21, 22, 23, 24, 25, 26, 27, 28, 29, 30, 31, 32, 33, 34, 35, 36, 37, 38, 39, 40

## WE-2,54mm_Box Header 61205022921
designator C?
WR-BHD 2.54mm Male Angled Box Header With Lever; Manufacturer: Würth Elektronik eiSos GmbH; ComponentLink1 Description: Manufacturer; ComponentLink2 Description: Datasheet; NoPins: 50; Created Date: 9 May 2013; partNo: 61205022921; ComponentLink1URL: http://www.we-online.com; ComponentLink2URL: http://katalog.we-online.de/em/datasheet/6120xx22921.pdf; Created by: Karrer Zheng
footprint 61205022921 (50 pins, right angeled, long lever, gold plating)
pins: 1, 2, 3, 4, 5, 6, 7, 8, 9, 10, 11, 12, 13, 14, 15, 16, 17, 18, 19, 20, 21, 22, 23, 24, 25, 26, 27, 28, 29, 30, 31, 32, 33, 34, 35, 36, 37, 38, 39, 40, 41, 42, 43, 44, 45, 46, 47, 48, 49, 50

## WE-2,54mm_Box Header 61206022921
designator C?
WR-BHD 2.54mm Male Angled Box Header With Lever; Manufacturer: Würth Elektronik eiSos GmbH; ComponentLink1 Description: Manufacturer; ComponentLink2 Description: Datasheet; NoPins: 60; Created Date: 9 May 2013; partNo: 61206022921; ComponentLink1URL: http://www.we-online.com; ComponentLink2URL: http://katalog.we-online.de/em/datasheet/6120xx22921.pdf; Created by: Karrer Zheng
footprint 61206022921 (60 pins, right angeled, long lever, gold plating)
pins: 1, 2, 3, 4, 5, 6, 7, 8, 9, 10, 11, 12, 13, 14, 15, 16, 17, 18, 19, 20, 21, 22, 23, 24, 25, 26, 27, 28, 29, 30, 31, 32, 33, 34, 35, 36, 37, 38, 39, 40, 41, 42, 43, 44, 45, 46, 47, 48, 49, 50, 51, 52, 53, 54, 55, 56, 57, 58, 59, 60